# Altium schematic symbol library jlcpcb_2025_04_capacitors_extended_0402.schlib: 3594 symbols (part 5 of 20) (continued)
## C0402C223K5RAC7867
designator C?  Capacitance: 22nF  (hidden comment: *)
Capacitor, Ceramic (MLCC), 22nF, ±10%, 50V, X7R, ±10%, SMD 0402; Manufacturer: KEMET; Manufacturer Part Number: C0402C223K5RAC7867; Package Size: 0402; JLCPCB Basic Part: No; JLCPCB Part Number: C141059; Supplier 1: LCSC; Category: Capacitors - MLCC; Supplier Part Number 1: C141059; Tolerance: ±10%; Voltage Rating: 50V; Temperature Coefficient: X7R; RoHS: Yes; ComponentLink1Description: Datasheet; ComponentLink1URL: https://wmsc.lcsc.com/wmsc/upload/file/pdf/v2/lcsc/2304140030_KEMET-C0402C223K5RAC7867_C141059.pdf; ComponentLink2Description: JLCPCB Part URL; ComponentLink2URL: https://jlcpcb.com/partdetail/C141059; ComponentLink3Description: LCSC Part URL; ComponentLink3URL: https://lcsc.com/product-detail/Multilayer-Ceramic-Capacitors-MLCC---SMD-SMT_KEMET-KEMET-C0402C223K5RAC7867_C141059.html
footprint CAP-0402 (0402 (1005M) Capacitor)
pins: 1, 2

## C0402C225M8PAC7867
designator C?  Capacitance: 2.2uF  (hidden comment: *)
Capacitor, Ceramic (MLCC), 2.2uF, ±20%, 10V, X5R, ±20%, SMD 0402; Manufacturer: KEMET; Manufacturer Part Number: C0402C225M8PAC7867; Package Size: 0402; JLCPCB Basic Part: No; JLCPCB Part Number: C696354; Supplier 1: LCSC; Category: Capacitors - MLCC; Supplier Part Number 1: C696354; Tolerance: ±20%; Voltage Rating: 10V; Temperature Coefficient: X5R; RoHS: Yes; ComponentLink1Description: Datasheet; ComponentLink1URL: https://wmsc.lcsc.com/wmsc/upload/file/pdf/v2/lcsc/2304140030_KEMET-C0402C225M8PAC7867_C696354.pdf; ComponentLink2Description: JLCPCB Part URL; ComponentLink2URL: https://jlcpcb.com/partdetail/C696354; ComponentLink3Description: LCSC Part URL; ComponentLink3URL: https://lcsc.com/product-detail/Multilayer-Ceramic-Capacitors-MLCC---SMD-SMT_KEMET-KEMET-C0402C225M8PAC7867_C696354.html
footprint CAP-0402 (0402 (1005M) Capacitor)
pins: 1, 2

## C0402C225M9PACTU
designator C?  Capacitance: 2.2uF  (hidden comment: *)
Capacitor, Ceramic (MLCC), 2.2uF, ±20%, 6.3V, X5R, ±20%, SMD 0402; Manufacturer: KEMET; Manufacturer Part Number: C0402C225M9PACTU; Package Size: 0402; JLCPCB Basic Part: No; JLCPCB Part Number: C452745; Supplier 1: LCSC; Category: Capacitors - MLCC; Supplier Part Number 1: C452745; Tolerance: ±20%; Voltage Rating: 6.3V; Temperature Coefficient: X5R; RoHS: Yes; ComponentLink1Description: Datasheet; ComponentLink1URL: https://wmsc.lcsc.com/wmsc/upload/file/pdf/v2/lcsc/2304140030_KEMET-C0402C225M9PACTU_C452745.pdf; ComponentLink2Description: JLCPCB Part URL; ComponentLink2URL: https://jlcpcb.com/partdetail/C452745; ComponentLink3Description: LCSC Part URL; ComponentLink3URL: https://lcsc.com/product-detail/Multilayer-Ceramic-Capacitors-MLCC---SMD-SMT_KEMET-KEMET-C0402C225M9PACTU_C452745.html
footprint CAP-0402 (0402 (1005M) Capacitor)
pins: 1, 2

## C0402C391K5RACAUTO
designator C?  Capacitance: 390pF  (hidden comment: *)
Capacitor, Ceramic (MLCC), 390pF, ±10%, 50V, X7R, ±10%, SMD 0402; Manufacturer: KEMET; Manufacturer Part Number: C0402C391K5RACAUTO; Package Size: 0402; JLCPCB Basic Part: No; JLCPCB Part Number: C561805; Supplier 1: LCSC; Category: Capacitors - MLCC; Supplier Part Number 1: C561805; Tolerance: ±10%; Voltage Rating: 50V; Temperature Coefficient: X7R; RoHS: Yes; ComponentLink1Description: Datasheet; ComponentLink1URL: https://wmsc.lcsc.com/wmsc/upload/file/pdf/v2/lcsc/2006031011_KEMET-C0402C391K5RACAUTO_C561805.pdf; ComponentLink2Description: JLCPCB Part URL; ComponentLink2URL: https://jlcpcb.com/partdetail/C561805; ComponentLink3Description: LCSC Part URL; ComponentLink3URL: https://lcsc.com/product-detail/Multilayer-Ceramic-Capacitors-MLCC---SMD-SMT_KEMET-KEMET-C0402C391K5RACAUTO_C561805.html
footprint CAP-0402 (0402 (1005M) Capacitor)
pins: 1, 2

## C0402C470J5GAC7867
designator C?  Capacitance: 47pF  (hidden comment: *)
Capacitor, Ceramic (MLCC), 47pF, ±5%, 50V, C0G, ±5%, SMD 0402; Manufacturer: KEMET; Manufacturer Part Number: C0402C470J5GAC7867; Package Size: 0402; JLCPCB Basic Part: No; JLCPCB Part Number: C140942; Supplier 1: LCSC; Category: Capacitors - MLCC; Supplier Part Number 1: C140942; Tolerance: ±5%; Voltage Rating: 50V; Temperature Coefficient: C0G; RoHS: Yes; ComponentLink1Description: Datasheet; ComponentLink1URL: https://wmsc.lcsc.com/wmsc/upload/file/pdf/v2/lcsc/2304140030_KEMET-C0402C470J5GAC7867_C140942.pdf; ComponentLink2Description: JLCPCB Part URL; ComponentLink2URL: https://jlcpcb.com/partdetail/C140942; ComponentLink3Description: LCSC Part URL; ComponentLink3URL: https://lcsc.com/product-detail/Multilayer-Ceramic-Capacitors-MLCC---SMD-SMT_KEMET-KEMET-C0402C470J5GAC7867_C140942.html
footprint CAP-0402 (0402 (1005M) Capacitor)
pins: 1, 2

## C0402C470K5GACTU
designator C?  Capacitance: 47pF  (hidden comment: *)
Capacitor, Ceramic (MLCC), 47pF, ±10%, 50V, C0G, ±10%, SMD 0402; Manufacturer: KEMET; Manufacturer Part Number: C0402C470K5GACTU; Package Size: 0402; JLCPCB Basic Part: No; JLCPCB Part Number: C2168628; Supplier 1: LCSC; Category: Capacitors - MLCC; Supplier Part Number 1: C2168628; Tolerance: ±10%; Voltage Rating: 50V; Temperature Coefficient: C0G; RoHS: Yes; ComponentLink1Description: Datasheet; ComponentLink1URL: https://wmsc.lcsc.com/wmsc/upload/file/pdf/v2/lcsc/2304140030_KEMET-C0402C470K5GACTU_C2168628.pdf; ComponentLink2Description: JLCPCB Part URL; ComponentLink2URL: https://jlcpcb.com/partdetail/C2168628; ComponentLink3Description: LCSC Part URL; ComponentLink3URL: https://lcsc.com/product-detail/Multilayer-Ceramic-Capacitors-MLCC---SMD-SMT_KEMET-KEMET-C0402C470K5GACTU_C2168628.html
footprint CAP-0402 (0402 (1005M) Capacitor)
pins: 1, 2

## C0402C474K9PAC7867
designator C?  Capacitance: 470nF  (hidden comment: *)
Capacitor, Ceramic (MLCC), 470nF, ±10%, 6.3V, X5R, ±10%, SMD 0402; Manufacturer: KEMET; Manufacturer Part Number: C0402C474K9PAC7867; Package Size: 0402; JLCPCB Basic Part: No; JLCPCB Part Number: C696355; Supplier 1: LCSC; Category: Capacitors - MLCC; Supplier Part Number 1: C696355; Tolerance: ±10%; Voltage Rating: 6.3V; Temperature Coefficient: X5R; RoHS: Yes; ComponentLink1Description: Datasheet; ComponentLink1URL: https://wmsc.lcsc.com/wmsc/upload/file/pdf/v2/lcsc/2304140030_KEMET-C0402C474K9PAC7867_C696355.pdf; ComponentLink2Description: JLCPCB Part URL; ComponentLink2URL: https://jlcpcb.com/partdetail/C696355; ComponentLink3Description: LCSC Part URL; ComponentLink3URL: https://lcsc.com/product-detail/Multilayer-Ceramic-Capacitors-MLCC---SMD-SMT_KEMET-KEMET-C0402C474K9PAC7867_C696355.html
footprint CAP-0402 (0402 (1005M) Capacitor)
pins: 1, 2

## C0402C822K5RAC7867
designator C?  Capacitance: 8.2nF  (hidden comment: *)
Capacitor, Ceramic (MLCC), 8.2nF, ±10%, 50V, X7R, ±10%, SMD 0402; Manufacturer: KEMET; Manufacturer Part Number: C0402C822K5RAC7867; Package Size: 0402; JLCPCB Basic Part: No; JLCPCB Part Number: C141063; Supplier 1: LCSC; Category: Capacitors - MLCC; Supplier Part Number 1: C141063; Tolerance: ±10%; Voltage Rating: 50V; Temperature Coefficient: X7R; RoHS: Yes; ComponentLink1Description: Datasheet; ComponentLink1URL: https://wmsc.lcsc.com/wmsc/upload/file/pdf/v2/lcsc/2304140030_KEMET-C0402C822K5RAC7867_C141063.pdf; ComponentLink2Description: JLCPCB Part URL; ComponentLink2URL: https://jlcpcb.com/partdetail/C141063; ComponentLink3Description: LCSC Part URL; ComponentLink3URL: https://lcsc.com/product-detail/Multilayer-Ceramic-Capacitors-MLCC---SMD-SMT_KEMET-KEMET-C0402C822K5RAC7867_C141063.html
footprint CAP-0402 (0402 (1005M) Capacitor)
pins: 1, 2

## C0402COG102J500NT
designator C?  Capacitance: 1nF  (hidden comment: *)
Capacitor, Ceramic (MLCC), 1nF, 50V, SMD 0402; Manufacturer: SANYEAR; Manufacturer Part Number: C0402COG102J500NT; Package Size: 0402; JLCPCB Basic Part: No; JLCPCB Part Number: C2835508; Supplier 1: LCSC; Category: Capacitors - MLCC; Supplier Part Number 1: C2835508; Voltage Rating: 50V; RoHS: Yes; ComponentLink1Description: Datasheet; ComponentLink1URL: https://wmsc.lcsc.com/wmsc/upload/file/pdf/v2/lcsc/2304140030_SANYEAR-C0402COG102J500NT_C2835508.pdf; ComponentLink2Description: JLCPCB Part URL; ComponentLink2URL: https://jlcpcb.com/partdetail/C2835508; ComponentLink3Description: LCSC Part URL; ComponentLink3URL: https://lcsc.com/product-detail/Multilayer-Ceramic-Capacitors-MLCC---SMD-SMT_SANYEAR-SANYEAR-C0402COG102J500NT_C2835508.html
footprint CAP-0402 (0402 (1005M) Capacitor)
pins: 1, 2

## C0402R105K010TOF
designator C?  Capacitance: 1uF  (hidden comment: *)
Capacitor, Ceramic (MLCC), 1uF, ±10%, 10V, X7S, ±10%, SMD 0402; Manufacturer: IHHEC(HOLY STONE ENTERPRISE CO., LTD); Manufacturer Part Number: C0402R105K010TOF; Package Size: 0402; JLCPCB Basic Part: No; JLCPCB Part Number: C4355178; Supplier 1: LCSC; Category: Capacitors - MLCC; Supplier Part Number 1: C4355178; Tolerance: ±10%; Voltage Rating: 10V; Temperature Coefficient: X7S; RoHS: Yes; ComponentLink1Description: Datasheet; ComponentLink1URL: https://wmsc.lcsc.com/wmsc/upload/file/pdf/v2/lcsc/2207151800_IHHEC-HOLY-STONE-ENTERPRISE-CO---LTD-C0402R105K010TOF_C4355178.pdf; ComponentLink2Description: JLCPCB Part URL; ComponentLink2URL: https://jlcpcb.com/partdetail/C4355178; ComponentLink3Description: LCSC Part URL; ComponentLink3URL: https://lcsc.com/product-detail/Multilayer-Ceramic-Capacitors-MLCC---SMD-SMT_IHHECHOLY-STONE-ENTERPRISE-CO.%2C-LTD-IHHECHOLY-STONE-ENTERPRISE-CO.%2C-LTD-C0402R105K010TOF_C4355178.html
footprint CAP-0402 (0402 (1005M) Capacitor)
pins: 1, 2

## C0402X5R103K250NTB
designator C?  Capacitance: 10nF  (hidden comment: *)
Capacitor, Ceramic (MLCC), 10nF, ±10%, 25V, X5R, ±10%, SMD 0402; Manufacturer: EYANG(Shenzhen Eyang Tech Development); Manufacturer Part Number: C0402X5R103K250NTB; Package Size: 0402; JLCPCB Basic Part: No; JLCPCB Part Number: C778299; Supplier 1: LCSC; Category: Capacitors - MLCC; Supplier Part Number 1: C778299; Tolerance: ±10%; Voltage Rating: 25V; Temperature Coefficient: X5R; RoHS: Yes; ComponentLink1Description: Datasheet; ComponentLink1URL: https://datasheet.lcsc.com/lcsc/2009051609_EYANG-Shenzhen-Eyang-Tech-Development-C0402X5R103K250NTB_C778299.pdf; ComponentLink2Description: JLCPCB Part URL; ComponentLink2URL: https://jlcpcb.com/partdetail/C778299; ComponentLink3Description: LCSC Part URL; ComponentLink3URL: https://lcsc.com/product-detail/Multilayer-Ceramic-Capacitors-MLCC---SMD-SMT_EYANGShenzhen-Eyang-Tech-Development-EYANGShenzhen-Eyang-Tech-Development-C0402X5R103K250NTB_C778299.html
footprint CAP-0402 (0402 (1005M) Capacitor)
pins: 1, 2

## C0402X5R104K160NTB
designator C?  Capacitance: 100nF  (hidden comment: *)
Capacitor, Ceramic (MLCC), 100nF, ±10%, 16V, X5R, ±10%, SMD 0402; Manufacturer: EYANG(Shenzhen Eyang Tech Development); Manufacturer Part Number: C0402X5R104K160NTB; Package Size: 0402; JLCPCB Basic Part: No; JLCPCB Part Number: C115656; Supplier 1: LCSC; Category: Capacitors - MLCC; Supplier Part Number 1: C115656; Tolerance: ±10%; Voltage Rating: 16V; Temperature Coefficient: X5R; RoHS: Yes; ComponentLink1Description: Datasheet; ComponentLink1URL: https://datasheet.lcsc.com/lcsc/2304140030_EYANG-Shenzhen-Eyang-Tech-Development-C0402X5R104K160NTB_C115656.pdf; ComponentLink2Description: JLCPCB Part URL; ComponentLink2URL: https://jlcpcb.com/partdetail/C115656; ComponentLink3Description: LCSC Part URL; ComponentLink3URL: https://lcsc.com/product-detail/Multilayer-Ceramic-Capacitors-MLCC---SMD-SMT_EYANGShenzhen-Eyang-Tech-Development-EYANGShenzhen-Eyang-Tech-Development-C0402X5R104K160NTB_C115656.html
footprint CAP-0402 (0402 (1005M) Capacitor)
pins: 1, 2

## C0402X5R105K160NT
designator C?  Capacitance: 1uF  (hidden comment: *)
Capacitor, Ceramic (MLCC), 1uF, ±10%, 16V, ±10%, SMD 0402; Manufacturer: SANYEAR; Manufacturer Part Number: C0402X5R105K160NT; Package Size: 0402; JLCPCB Basic Part: No; JLCPCB Part Number: C466611; Supplier 1: LCSC; Category: Capacitors - MLCC; Supplier Part Number 1: C466611; Tolerance: ±10%; Voltage Rating: 16V; RoHS: Yes; ComponentLink1Description: Datasheet; ComponentLink1URL: https://wmsc.lcsc.com/wmsc/upload/file/pdf/v2/lcsc/2304140030_SANYEAR-C0402X5R105K160NT_C466611.pdf; ComponentLink2Description: JLCPCB Part URL; ComponentLink2URL: https://jlcpcb.com/partdetail/C466611; ComponentLink3Description: LCSC Part URL; ComponentLink3URL: https://lcsc.com/product-detail/Multilayer-Ceramic-Capacitors-MLCC---SMD-SMT_SANYEAR-SANYEAR-C0402X5R105K160NT_C466611.html
footprint CAP-0402 (0402 (1005M) Capacitor)
pins: 1, 2

## C0402X5R105K250NT
designator C?  Capacitance: 1uF  (hidden comment: *)
Capacitor, Ceramic (MLCC), 1uF, ±10%, 25V, X5R, ±10%, SMD 0402; Manufacturer: SANYEAR; Manufacturer Part Number: C0402X5R105K250NT; Package Size: 0402; JLCPCB Basic Part: No; JLCPCB Part Number: C466612; Supplier 1: LCSC; Category: Capacitors - MLCC; Supplier Part Number 1: C466612; Tolerance: ±10%; Voltage Rating: 25V; Temperature Coefficient: X5R; RoHS: Yes; ComponentLink1Description: Datasheet; ComponentLink1URL: https://wmsc.lcsc.com/wmsc/upload/file/pdf/v2/lcsc/2304140030_SANYEAR-C0402X5R105K250NT_C466612.pdf; ComponentLink2Description: JLCPCB Part URL; ComponentLink2URL: https://jlcpcb.com/partdetail/C466612; ComponentLink3Description: LCSC Part URL; ComponentLink3URL: https://lcsc.com/product-detail/Multilayer-Ceramic-Capacitors-MLCC---SMD-SMT_SANYEAR-SANYEAR-C0402X5R105K250NT_C466612.html
footprint CAP-0402 (0402 (1005M) Capacitor)
pins: 1, 2

## C0402X5R105M6R3NT
designator C?  Capacitance: 1uF  (hidden comment: *)
Capacitor, Ceramic (MLCC), 1uF, ±20%, 6.3V, X5R, ±20%, SMD 0402; Manufacturer: SANYEAR; Manufacturer Part Number: C0402X5R105M6R3NT; Package Size: 0402; JLCPCB Basic Part: No; JLCPCB Part Number: C475247; Supplier 1: LCSC; Category: Capacitors - MLCC; Supplier Part Number 1: C475247; Tolerance: ±20%; Voltage Rating: 6.3V; Temperature Coefficient: X5R; RoHS: Yes; ComponentLink1Description: Datasheet; ComponentLink1URL: https://wmsc.lcsc.com/wmsc/upload/file/pdf/v2/lcsc/2304140030_SANYEAR-C0402X5R105M6R3NT_C475247.pdf; ComponentLink2Description: JLCPCB Part URL; ComponentLink2URL: https://jlcpcb.com/partdetail/C475247; ComponentLink3Description: LCSC Part URL; ComponentLink3URL: https://lcsc.com/product-detail/Multilayer-Ceramic-Capacitors-MLCC---SMD-SMT_SANYEAR-SANYEAR-C0402X5R105M6R3NT_C475247.html
footprint CAP-0402 (0402 (1005M) Capacitor)
pins: 1, 2

## C0402X5R223K500NTB
designator C?  Capacitance: 22nF  (hidden comment: *)
Capacitor, Ceramic (MLCC), 22nF, ±10%, 50V, X5R, ±10%, SMD 0402; Manufacturer: EYANG(Shenzhen Eyang Tech Development); Manufacturer Part Number: C0402X5R223K500NTB; Package Size: 0402; JLCPCB Basic Part: No; JLCPCB Part Number: C115662; Supplier 1: LCSC; Category: Capacitors - MLCC; Supplier Part Number 1: C115662; Tolerance: ±10%; Voltage Rating: 50V; Temperature Coefficient: X5R; RoHS: Yes; ComponentLink1Description: Datasheet; ComponentLink1URL: https://datasheet.lcsc.com/lcsc/2304140030_EYANG-Shenzhen-Eyang-Tech-Development-C0402X5R223K500NTB_C115662.pdf; ComponentLink2Description: JLCPCB Part URL; ComponentLink2URL: https://jlcpcb.com/partdetail/C115662; ComponentLink3Description: LCSC Part URL; ComponentLink3URL: https://lcsc.com/product-detail/Multilayer-Ceramic-Capacitors-MLCC---SMD-SMT_EYANGShenzhen-Eyang-Tech-Development-EYANGShenzhen-Eyang-Tech-Development-C0402X5R223K500NTB_C115662.html
footprint CAP-0402 (0402 (1005M) Capacitor)
pins: 1, 2

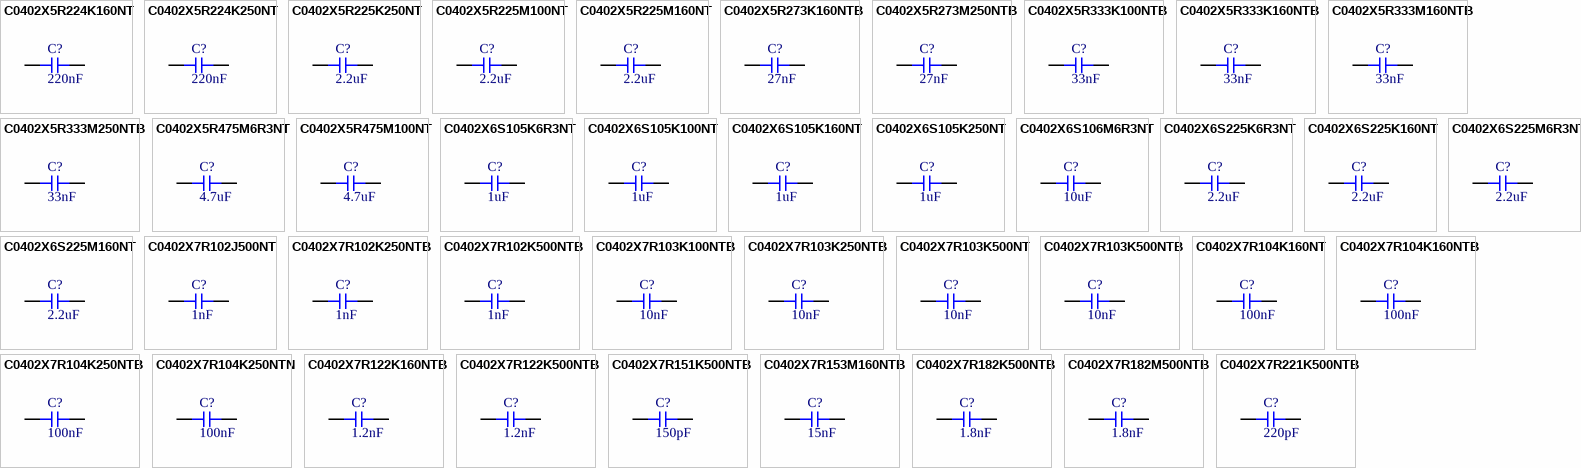
[diagram p21: symbols C0402X5R224K160NT to C0402X7R221K500NTB]

## C0402X5R224K160NT
designator C?  Capacitance: 220nF  (hidden comment: *)
Capacitor, Ceramic (MLCC), 220nF, ±10%, 16V, X5R, ±10%, SMD 0402; Manufacturer: SANYEAR; Manufacturer Part Number: C0402X5R224K160NT; Package Size: 0402; JLCPCB Basic Part: No; JLCPCB Part Number: C466616; Supplier 1: LCSC; Category: Capacitors - MLCC; Supplier Part Number 1: C466616; Tolerance: ±10%; Voltage Rating: 16V; Temperature Coefficient: X5R; RoHS: Yes; ComponentLink1Description: Datasheet; ComponentLink1URL: https://wmsc.lcsc.com/wmsc/upload/file/pdf/v2/lcsc/2304140030_SANYEAR-C0402X5R224K160NT_C466616.pdf; ComponentLink2Description: JLCPCB Part URL; ComponentLink2URL: https://jlcpcb.com/partdetail/C466616; ComponentLink3Description: LCSC Part URL; ComponentLink3URL: https://lcsc.com/product-detail/Multilayer-Ceramic-Capacitors-MLCC---SMD-SMT_SANYEAR-SANYEAR-C0402X5R224K160NT_C466616.html
footprint CAP-0402 (0402 (1005M) Capacitor)
pins: 1, 2

## C0402X5R224K250NT
designator C?  Capacitance: 220nF  (hidden comment: *)
Capacitor, Ceramic (MLCC), 220nF, ±10%, 25V, X5R, ±10%, SMD 0402; Manufacturer: SANYEAR; Manufacturer Part Number: C0402X5R224K250NT; Package Size: 0402; JLCPCB Basic Part: No; JLCPCB Part Number: C466617; Supplier 1: LCSC; Category: Capacitors - MLCC; Supplier Part Number 1: C466617; Tolerance: ±10%; Voltage Rating: 25V; Temperature Coefficient: X5R; RoHS: Yes; ComponentLink1Description: Datasheet; ComponentLink1URL: https://wmsc.lcsc.com/wmsc/upload/file/pdf/v2/lcsc/2304140030_SANYEAR-C0402X5R224K250NT_C466617.pdf; ComponentLink2Description: JLCPCB Part URL; ComponentLink2URL: https://jlcpcb.com/partdetail/C466617; ComponentLink3Description: LCSC Part URL; ComponentLink3URL: https://lcsc.com/product-detail/Multilayer-Ceramic-Capacitors-MLCC---SMD-SMT_SANYEAR-SANYEAR-C0402X5R224K250NT_C466617.html
footprint CAP-0402 (0402 (1005M) Capacitor)
pins: 1, 2

## C0402X5R225K250NT
designator C?  Capacitance: 2.2uF  (hidden comment: *)
Capacitor, Ceramic (MLCC), 2.2uF, ±10%, 25V, ±10%, SMD 0402; Manufacturer: SANYEAR; Manufacturer Part Number: C0402X5R225K250NT; Package Size: 0402; JLCPCB Basic Part: No; JLCPCB Part Number: C729452; Supplier 1: LCSC; Category: Capacitors - MLCC; Supplier Part Number 1: C729452; Tolerance: ±10%; Voltage Rating: 25V; RoHS: Yes; ComponentLink1Description: Datasheet; ComponentLink1URL: https://wmsc.lcsc.com/wmsc/upload/file/pdf/v2/lcsc/2304140030_SANYEAR-C0402X5R225K250NT_C729452.pdf; ComponentLink2Description: JLCPCB Part URL; ComponentLink2URL: https://jlcpcb.com/partdetail/C729452; ComponentLink3Description: LCSC Part URL; ComponentLink3URL: https://lcsc.com/product-detail/Multilayer-Ceramic-Capacitors-MLCC---SMD-SMT_SANYEAR-SANYEAR-C0402X5R225K250NT_C729452.html
footprint CAP-0402 (0402 (1005M) Capacitor)
pins: 1, 2

## C0402X5R225M100NT
designator C?  Capacitance: 2.2uF  (hidden comment: *)
Capacitor, Ceramic (MLCC), 2.2uF, ±20%, 10V, ±20%, SMD 0402; Manufacturer: SANYEAR; Manufacturer Part Number: C0402X5R225M100NT; Package Size: 0402; JLCPCB Basic Part: No; JLCPCB Part Number: C466619; Supplier 1: LCSC; Category: Capacitors - MLCC; Supplier Part Number 1: C466619; Tolerance: ±20%; Voltage Rating: 10V; RoHS: Yes; ComponentLink1Description: Datasheet; ComponentLink1URL: https://wmsc.lcsc.com/wmsc/upload/file/pdf/v2/lcsc/2304140030_SANYEAR-C0402X5R225M100NT_C466619.pdf; ComponentLink2Description: JLCPCB Part URL; ComponentLink2URL: https://jlcpcb.com/partdetail/C466619; ComponentLink3Description: LCSC Part URL; ComponentLink3URL: https://lcsc.com/product-detail/Multilayer-Ceramic-Capacitors-MLCC---SMD-SMT_SANYEAR-SANYEAR-C0402X5R225M100NT_C466619.html
footprint CAP-0402 (0402 (1005M) Capacitor)
pins: 1, 2

## C0402X5R225M160NT
designator C?  Capacitance: 2.2uF  (hidden comment: *)
Capacitor, Ceramic (MLCC), 2.2uF, ±20%, 16V, ±20%, SMD 0402; Manufacturer: SANYEAR; Manufacturer Part Number: C0402X5R225M160NT; Package Size: 0402; JLCPCB Basic Part: No; JLCPCB Part Number: C729449; Supplier 1: LCSC; Category: Capacitors - MLCC; Supplier Part Number 1: C729449; Tolerance: ±20%; Voltage Rating: 16V; RoHS: Yes; ComponentLink1Description: Datasheet; ComponentLink1URL: https://wmsc.lcsc.com/wmsc/upload/file/pdf/v2/lcsc/2304140030_SANYEAR-C0402X5R225M160NT_C729449.pdf; ComponentLink2Description: JLCPCB Part URL; ComponentLink2URL: https://jlcpcb.com/partdetail/C729449; ComponentLink3Description: LCSC Part URL; ComponentLink3URL: https://lcsc.com/product-detail/Multilayer-Ceramic-Capacitors-MLCC---SMD-SMT_SANYEAR-SANYEAR-C0402X5R225M160NT_C729449.html
footprint CAP-0402 (0402 (1005M) Capacitor)
pins: 1, 2

## C0402X5R273K160NTB
designator C?  Capacitance: 27nF  (hidden comment: *)
Capacitor, Ceramic (MLCC), 27nF, ±10%, 16V, X5R, ±10%, SMD 0402; Manufacturer: EYANG(Shenzhen Eyang Tech Development); Manufacturer Part Number: C0402X5R273K160NTB; Package Size: 0402; JLCPCB Basic Part: No; JLCPCB Part Number: C778312; Supplier 1: LCSC; Category: Capacitors - MLCC; Supplier Part Number 1: C778312; Tolerance: ±10%; Voltage Rating: 16V; Temperature Coefficient: X5R; RoHS: Yes; ComponentLink1Description: Datasheet; ComponentLink1URL: https://datasheet.lcsc.com/lcsc/2009051609_EYANG-Shenzhen-Eyang-Tech-Development-C0402X5R273K160NTB_C778312.pdf; ComponentLink2Description: JLCPCB Part URL; ComponentLink2URL: https://jlcpcb.com/partdetail/C778312; ComponentLink3Description: LCSC Part URL; ComponentLink3URL: https://lcsc.com/product-detail/Multilayer-Ceramic-Capacitors-MLCC---SMD-SMT_EYANGShenzhen-Eyang-Tech-Development-EYANGShenzhen-Eyang-Tech-Development-C0402X5R273K160NTB_C778312.html
footprint CAP-0402 (0402 (1005M) Capacitor)
pins: 1, 2

## C0402X5R273M250NTB
designator C?  Capacitance: 27nF  (hidden comment: *)
Capacitor, Ceramic (MLCC), 27nF, ±20%, 25V, X5R, ±20%, SMD 0402; Manufacturer: EYANG(Shenzhen Eyang Tech Development); Manufacturer Part Number: C0402X5R273M250NTB; Package Size: 0402; JLCPCB Basic Part: No; JLCPCB Part Number: C778223; Supplier 1: LCSC; Category: Capacitors - MLCC; Supplier Part Number 1: C778223; Tolerance: ±20%; Voltage Rating: 25V; Temperature Coefficient: X5R; RoHS: Yes; ComponentLink1Description: Datasheet; ComponentLink1URL: https://datasheet.lcsc.com/lcsc/2009051507_EYANG-Shenzhen-Eyang-Tech-Development-C0402X5R273M250NTB_C778223.pdf; ComponentLink2Description: JLCPCB Part URL; ComponentLink2URL: https://jlcpcb.com/partdetail/C778223; ComponentLink3Description: LCSC Part URL; ComponentLink3URL: https://lcsc.com/product-detail/Multilayer-Ceramic-Capacitors-MLCC---SMD-SMT_EYANGShenzhen-Eyang-Tech-Development-EYANGShenzhen-Eyang-Tech-Development-C0402X5R273M250NTB_C778223.html
footprint CAP-0402 (0402 (1005M) Capacitor)
pins: 1, 2

## C0402X5R333K100NTB
designator C?  Capacitance: 33nF  (hidden comment: *)
Capacitor, Ceramic (MLCC), 33nF, ±10%, 10V, X5R, ±10%, SMD 0402; Manufacturer: EYANG(Shenzhen Eyang Tech Development); Manufacturer Part Number: C0402X5R333K100NTB; Package Size: 0402; JLCPCB Basic Part: No; JLCPCB Part Number: C183772; Supplier 1: LCSC; Category: Capacitors - MLCC; Supplier Part Number 1: C183772; Tolerance: ±10%; Voltage Rating: 10V; Temperature Coefficient: X5R; RoHS: Yes; ComponentLink1Description: Datasheet; ComponentLink1URL: https://datasheet.lcsc.com/lcsc/2304140030_EYANG-Shenzhen-Eyang-Tech-Development-C0402X5R333K100NTB_C183772.pdf; ComponentLink2Description: JLCPCB Part URL; ComponentLink2URL: https://jlcpcb.com/partdetail/C183772; ComponentLink3Description: LCSC Part URL; ComponentLink3URL: https://lcsc.com/product-detail/Multilayer-Ceramic-Capacitors-MLCC---SMD-SMT_EYANGShenzhen-Eyang-Tech-Development-EYANGShenzhen-Eyang-Tech-Development-C0402X5R333K100NTB_C183772.html
footprint CAP-0402 (0402 (1005M) Capacitor)
pins: 1, 2

## C0402X5R333K160NTB
designator C?  Capacitance: 33nF  (hidden comment: *)
Capacitor, Ceramic (MLCC), 33nF, ±10%, 16V, X5R, ±10%, SMD 0402; Manufacturer: EYANG(Shenzhen Eyang Tech Development); Manufacturer Part Number: C0402X5R333K160NTB; Package Size: 0402; JLCPCB Basic Part: No; JLCPCB Part Number: C115664; Supplier 1: LCSC; Category: Capacitors - MLCC; Supplier Part Number 1: C115664; Tolerance: ±10%; Voltage Rating: 16V; Temperature Coefficient: X5R; RoHS: Yes; ComponentLink1Description: Datasheet; ComponentLink1URL: https://datasheet.lcsc.com/lcsc/2304140030_EYANG-Shenzhen-Eyang-Tech-Development-C0402X5R333K160NTB_C115664.pdf; ComponentLink2Description: JLCPCB Part URL; ComponentLink2URL: https://jlcpcb.com/partdetail/C115664; ComponentLink3Description: LCSC Part URL; ComponentLink3URL: https://lcsc.com/product-detail/Multilayer-Ceramic-Capacitors-MLCC---SMD-SMT_EYANGShenzhen-Eyang-Tech-Development-EYANGShenzhen-Eyang-Tech-Development-C0402X5R333K160NTB_C115664.html
footprint CAP-0402 (0402 (1005M) Capacitor)
pins: 1, 2

## C0402X5R333M160NTB
designator C?  Capacitance: 33nF  (hidden comment: *)
Capacitor, Ceramic (MLCC), 33nF, ±20%, 16V, X5R, ±20%, SMD 0402; Manufacturer: EYANG(Shenzhen Eyang Tech Development); Manufacturer Part Number: C0402X5R333M160NTB; Package Size: 0402; JLCPCB Basic Part: No; JLCPCB Part Number: C183769; Supplier 1: LCSC; Category: Capacitors - MLCC; Supplier Part Number 1: C183769; Tolerance: ±20%; Voltage Rating: 16V; Temperature Coefficient: X5R; RoHS: Yes; ComponentLink1Description: Datasheet; ComponentLink1URL: https://datasheet.lcsc.com/lcsc/2304140030_EYANG-Shenzhen-Eyang-Tech-Development-C0402X5R333M160NTB_C183769.pdf; ComponentLink2Description: JLCPCB Part URL; ComponentLink2URL: https://jlcpcb.com/partdetail/C183769; ComponentLink3Description: LCSC Part URL; ComponentLink3URL: https://lcsc.com/product-detail/Multilayer-Ceramic-Capacitors-MLCC---SMD-SMT_EYANGShenzhen-Eyang-Tech-Development-EYANGShenzhen-Eyang-Tech-Development-C0402X5R333M160NTB_C183769.html
footprint CAP-0402 (0402 (1005M) Capacitor)
pins: 1, 2

## C0402X5R333M250NTB
designator C?  Capacitance: 33nF  (hidden comment: *)
Capacitor, Ceramic (MLCC), 33nF, ±20%, 25V, X5R, ±20%, SMD 0402; Manufacturer: EYANG(Shenzhen Eyang Tech Development); Manufacturer Part Number: C0402X5R333M250NTB; Package Size: 0402; JLCPCB Basic Part: No; JLCPCB Part Number: C188402; Supplier 1: LCSC; Category: Capacitors - MLCC; Supplier Part Number 1: C188402; Tolerance: ±20%; Voltage Rating: 25V; Temperature Coefficient: X5R; RoHS: Yes; ComponentLink1Description: Datasheet; ComponentLink1URL: https://datasheet.lcsc.com/lcsc/1811021623_EYANG-Shenzhen-Eyang-Tech-Development-C0402X5R333M250NTB_C188402.pdf; ComponentLink2Description: JLCPCB Part URL; ComponentLink2URL: https://jlcpcb.com/partdetail/C188402; ComponentLink3Description: LCSC Part URL; ComponentLink3URL: https://lcsc.com/product-detail/Multilayer-Ceramic-Capacitors-MLCC---SMD-SMT_EYANGShenzhen-Eyang-Tech-Development-EYANGShenzhen-Eyang-Tech-Development-C0402X5R333M250NTB_C188402.html
footprint CAP-0402 (0402 (1005M) Capacitor)
pins: 1, 2

## C0402X5R475M6R3NT
designator C?  Capacitance: 4.7uF  (hidden comment: *)
Capacitor, Ceramic (MLCC), 4.7uF, ±20%, 6.3V, ±20%, SMD 0402; Manufacturer: SANYEAR; Manufacturer Part Number: C0402X5R475M6R3NT; Package Size: 0402; JLCPCB Basic Part: No; JLCPCB Part Number: C466620; Supplier 1: LCSC; Category: Capacitors - MLCC; Supplier Part Number 1: C466620; Tolerance: ±20%; Voltage Rating: 6.3V; RoHS: Yes; ComponentLink1Description: Datasheet; ComponentLink1URL: https://wmsc.lcsc.com/wmsc/upload/file/pdf/v2/lcsc/2304140030_SANYEAR-C0402X5R475M6R3NT_C466620.pdf; ComponentLink2Description: JLCPCB Part URL; ComponentLink2URL: https://jlcpcb.com/partdetail/C466620; ComponentLink3Description: LCSC Part URL; ComponentLink3URL: https://lcsc.com/product-detail/Multilayer-Ceramic-Capacitors-MLCC---SMD-SMT_SANYEAR-SANYEAR-C0402X5R475M6R3NT_C466620.html
footprint CAP-0402 (0402 (1005M) Capacitor)
pins: 1, 2

## C0402X5R475M100NT
designator C?  Capacitance: 4.7uF  (hidden comment: *)
Capacitor, Ceramic (MLCC), 4.7uF, ±20%, 10V, X5R, ±20%, SMD 0402; Manufacturer: SANYEAR; Manufacturer Part Number: C0402X5R475M100NT; Package Size: 0402; JLCPCB Basic Part: No; JLCPCB Part Number: C466621; Supplier 1: LCSC; Category: Capacitors - MLCC; Supplier Part Number 1: C466621; Tolerance: ±20%; Voltage Rating: 10V; Temperature Coefficient: X5R; RoHS: Yes; ComponentLink1Description: Datasheet; ComponentLink1URL: https://wmsc.lcsc.com/wmsc/upload/file/pdf/v2/lcsc/2304140030_SANYEAR-C0402X5R475M100NT_C466621.pdf; ComponentLink2Description: JLCPCB Part URL; ComponentLink2URL: https://jlcpcb.com/partdetail/C466621; ComponentLink3Description: LCSC Part URL; ComponentLink3URL: https://lcsc.com/product-detail/Multilayer-Ceramic-Capacitors-MLCC---SMD-SMT_SANYEAR-SANYEAR-C0402X5R475M100NT_C466621.html
footprint CAP-0402 (0402 (1005M) Capacitor)
pins: 1, 2

## C0402X6S105K6R3NT
designator C?  Capacitance: 1uF  (hidden comment: *)
Capacitor, Ceramic (MLCC), 1uF, ±10%, 6.3V, ±10%, SMD 0402; Manufacturer: SANYEAR; Manufacturer Part Number: C0402X6S105K6R3NT; Package Size: 0402; JLCPCB Basic Part: No; JLCPCB Part Number: C2844323; Supplier 1: LCSC; Category: Capacitors - MLCC; Supplier Part Number 1: C2844323; Tolerance: ±10%; Voltage Rating: 6.3V; RoHS: Yes; ComponentLink1Description: Datasheet; ComponentLink1URL: https://wmsc.lcsc.com/wmsc/upload/file/pdf/v2/lcsc/2304140030_SANYEAR-C0402X6S105K6R3NT_C2844323.pdf; ComponentLink2Description: JLCPCB Part URL; ComponentLink2URL: https://jlcpcb.com/partdetail/C2844323; ComponentLink3Description: LCSC Part URL; ComponentLink3URL: https://lcsc.com/product-detail/Multilayer-Ceramic-Capacitors-MLCC---SMD-SMT_SANYEAR-SANYEAR-C0402X6S105K6R3NT_C2844323.html
footprint CAP-0402 (0402 (1005M) Capacitor)
pins: 1, 2

## C0402X6S105K100NT
designator C?  Capacitance: 1uF  (hidden comment: *)
Capacitor, Ceramic (MLCC), 1uF, ±10%, 10V, ±10%, SMD 0402; Manufacturer: SANYEAR; Manufacturer Part Number: C0402X6S105K100NT; Package Size: 0402; JLCPCB Basic Part: No; JLCPCB Part Number: C2844322; Supplier 1: LCSC; Category: Capacitors - MLCC; Supplier Part Number 1: C2844322; Tolerance: ±10%; Voltage Rating: 10V; RoHS: Yes; ComponentLink1Description: Datasheet; ComponentLink1URL: https://wmsc.lcsc.com/wmsc/upload/file/pdf/v2/lcsc/2304140030_SANYEAR-C0402X6S105K100NT_C2844322.pdf; ComponentLink2Description: JLCPCB Part URL; ComponentLink2URL: https://jlcpcb.com/partdetail/C2844322; ComponentLink3Description: LCSC Part URL; ComponentLink3URL: https://lcsc.com/product-detail/Multilayer-Ceramic-Capacitors-MLCC---SMD-SMT_SANYEAR-SANYEAR-C0402X6S105K100NT_C2844322.html
footprint CAP-0402 (0402 (1005M) Capacitor)
pins: 1, 2

## C0402X6S105K160NT
designator C?  Capacitance: 1uF  (hidden comment: *)
Capacitor, Ceramic (MLCC), 1uF, ±10%, 16V, ±10%, SMD 0402; Manufacturer: SANYEAR; Manufacturer Part Number: C0402X6S105K160NT; Package Size: 0402; JLCPCB Basic Part: No; JLCPCB Part Number: C2835564; Supplier 1: LCSC; Category: Capacitors - MLCC; Supplier Part Number 1: C2835564; Tolerance: ±10%; Voltage Rating: 16V; RoHS: Yes; ComponentLink1Description: Datasheet; ComponentLink1URL: https://wmsc.lcsc.com/wmsc/upload/file/pdf/v2/lcsc/2304140030_SANYEAR-C0402X6S105K160NT_C2835564.pdf; ComponentLink2Description: JLCPCB Part URL; ComponentLink2URL: https://jlcpcb.com/partdetail/C2835564; ComponentLink3Description: LCSC Part URL; ComponentLink3URL: https://lcsc.com/product-detail/Multilayer-Ceramic-Capacitors-MLCC---SMD-SMT_SANYEAR-SANYEAR-C0402X6S105K160NT_C2835564.html
footprint CAP-0402 (0402 (1005M) Capacitor)
pins: 1, 2

## C0402X6S105K250NT
designator C?  Capacitance: 1uF  (hidden comment: *)
Capacitor, Ceramic (MLCC), 1uF, ±10%, 25V, ±10%, SMD 0402; Manufacturer: SANYEAR; Manufacturer Part Number: C0402X6S105K250NT; Package Size: 0402; JLCPCB Basic Part: No; JLCPCB Part Number: C2835563; Supplier 1: LCSC; Category: Capacitors - MLCC; Supplier Part Number 1: C2835563; Tolerance: ±10%; Voltage Rating: 25V; RoHS: Yes; ComponentLink1Description: Datasheet; ComponentLink1URL: https://wmsc.lcsc.com/wmsc/upload/file/pdf/v2/lcsc/2304140030_SANYEAR-C0402X6S105K250NT_C2835563.pdf; ComponentLink2Description: JLCPCB Part URL; ComponentLink2URL: https://jlcpcb.com/partdetail/C2835563; ComponentLink3Description: LCSC Part URL; ComponentLink3URL: https://lcsc.com/product-detail/Multilayer-Ceramic-Capacitors-MLCC---SMD-SMT_SANYEAR-SANYEAR-C0402X6S105K250NT_C2835563.html
footprint CAP-0402 (0402 (1005M) Capacitor)
pins: 1, 2

## C0402X6S106M6R3NT
designator C?  Capacitance: 10uF  (hidden comment: *)
Capacitor, Ceramic (MLCC), 10uF, 6.3V, SMD 0402; Manufacturer: SANYEAR; Manufacturer Part Number: C0402X6S106M6R3NT; Package Size: 0402; JLCPCB Basic Part: No; JLCPCB Part Number: C2835561; Supplier 1: LCSC; Category: Capacitors - MLCC; Supplier Part Number 1: C2835561; Voltage Rating: 6.3V; RoHS: Yes; ComponentLink1Description: Datasheet; ComponentLink1URL: https://wmsc.lcsc.com/wmsc/upload/file/pdf/v2/lcsc/2304140030_SANYEAR-C0402X6S106M6R3NT_C2835561.pdf; ComponentLink2Description: JLCPCB Part URL; ComponentLink2URL: https://jlcpcb.com/partdetail/C2835561; ComponentLink3Description: LCSC Part URL; ComponentLink3URL: https://lcsc.com/product-detail/Multilayer-Ceramic-Capacitors-MLCC---SMD-SMT_SANYEAR-SANYEAR-C0402X6S106M6R3NT_C2835561.html
footprint CAP-0402 (0402 (1005M) Capacitor)
pins: 1, 2

## C0402X6S225K6R3NT
designator C?  Capacitance: 2.2uF  (hidden comment: *)
Capacitor, Ceramic (MLCC), 2.2uF, ±10%, 6.3V, ±10%, SMD 0402; Manufacturer: SANYEAR; Manufacturer Part Number: C0402X6S225K6R3NT; Package Size: 0402; JLCPCB Basic Part: No; JLCPCB Part Number: C2844324; Supplier 1: LCSC; Category: Capacitors - MLCC; Supplier Part Number 1: C2844324; Tolerance: ±10%; Voltage Rating: 6.3V; RoHS: Yes; ComponentLink1Description: Datasheet; ComponentLink1URL: https://wmsc.lcsc.com/wmsc/upload/file/pdf/v2/lcsc/2304140030_SANYEAR-C0402X6S225K6R3NT_C2844324.pdf; ComponentLink2Description: JLCPCB Part URL; ComponentLink2URL: https://jlcpcb.com/partdetail/C2844324; ComponentLink3Description: LCSC Part URL; ComponentLink3URL: https://lcsc.com/product-detail/Multilayer-Ceramic-Capacitors-MLCC---SMD-SMT_SANYEAR-SANYEAR-C0402X6S225K6R3NT_C2844324.html
footprint CAP-0402 (0402 (1005M) Capacitor)
pins: 1, 2

## C0402X6S225K160NT
designator C?  Capacitance: 2.2uF  (hidden comment: *)
Capacitor, Ceramic (MLCC), 2.2uF, ±10%, 16V, ±10%, SMD 0402; Manufacturer: SANYEAR; Manufacturer Part Number: C0402X6S225K160NT; Package Size: 0402; JLCPCB Basic Part: No; JLCPCB Part Number: C2844321; Supplier 1: LCSC; Category: Capacitors - MLCC; Supplier Part Number 1: C2844321; Tolerance: ±10%; Voltage Rating: 16V; RoHS: Yes; ComponentLink1Description: Datasheet; ComponentLink1URL: https://wmsc.lcsc.com/wmsc/upload/file/pdf/v2/lcsc/2304140030_SANYEAR-C0402X6S225K160NT_C2844321.pdf; ComponentLink2Description: JLCPCB Part URL; ComponentLink2URL: https://jlcpcb.com/partdetail/C2844321; ComponentLink3Description: LCSC Part URL; ComponentLink3URL: https://lcsc.com/product-detail/Multilayer-Ceramic-Capacitors-MLCC---SMD-SMT_SANYEAR-SANYEAR-C0402X6S225K160NT_C2844321.html
footprint CAP-0402 (0402 (1005M) Capacitor)
pins: 1, 2

## C0402X6S225M6R3NT
designator C?  Capacitance: 2.2uF  (hidden comment: *)
Capacitor, Ceramic (MLCC), 2.2uF, 6.3V, SMD 0402; Manufacturer: SANYEAR; Manufacturer Part Number: C0402X6S225M6R3NT; Package Size: 0402; JLCPCB Basic Part: No; JLCPCB Part Number: C2835560; Supplier 1: LCSC; Category: Capacitors - MLCC; Supplier Part Number 1: C2835560; Voltage Rating: 6.3V; RoHS: Yes; ComponentLink1Description: Datasheet; ComponentLink1URL: https://wmsc.lcsc.com/wmsc/upload/file/pdf/v2/lcsc/2304140030_SANYEAR-C0402X6S225M6R3NT_C2835560.pdf; ComponentLink2Description: JLCPCB Part URL; ComponentLink2URL: https://jlcpcb.com/partdetail/C2835560; ComponentLink3Description: LCSC Part URL; ComponentLink3URL: https://lcsc.com/product-detail/Multilayer-Ceramic-Capacitors-MLCC---SMD-SMT_SANYEAR-SANYEAR-C0402X6S225M6R3NT_C2835560.html
footprint CAP-0402 (0402 (1005M) Capacitor)
pins: 1, 2

## C0402X6S225M160NT
designator C?  Capacitance: 2.2uF  (hidden comment: *)
Capacitor, Ceramic (MLCC), 2.2uF, 16V, SMD 0402; Manufacturer: SANYEAR; Manufacturer Part Number: C0402X6S225M160NT; Package Size: 0402; JLCPCB Basic Part: No; JLCPCB Part Number: C2844326; Supplier 1: LCSC; Category: Capacitors - MLCC; Supplier Part Number 1: C2844326; Voltage Rating: 16V; RoHS: Yes; ComponentLink1Description: Datasheet; ComponentLink1URL: https://wmsc.lcsc.com/wmsc/upload/file/pdf/v2/lcsc/2304140030_SANYEAR-C0402X6S225M160NT_C2844326.pdf; ComponentLink2Description: JLCPCB Part URL; ComponentLink2URL: https://jlcpcb.com/partdetail/C2844326; ComponentLink3Description: LCSC Part URL; ComponentLink3URL: https://lcsc.com/product-detail/Multilayer-Ceramic-Capacitors-MLCC---SMD-SMT_SANYEAR-SANYEAR-C0402X6S225M160NT_C2844326.html
footprint CAP-0402 (0402 (1005M) Capacitor)
pins: 1, 2

## C0402X7R102J500NT
designator C?  Capacitance: 1nF  (hidden comment: *)
Capacitor, Ceramic (MLCC), 1nF, 50V, SMD 0402; Manufacturer: SANYEAR; Manufacturer Part Number: C0402X7R102J500NT; Package Size: 0402; JLCPCB Basic Part: No; JLCPCB Part Number: C2835536; Supplier 1: LCSC; Category: Capacitors - MLCC; Supplier Part Number 1: C2835536; Voltage Rating: 50V; RoHS: Yes; ComponentLink1Description: Datasheet; ComponentLink1URL: https://wmsc.lcsc.com/wmsc/upload/file/pdf/v2/lcsc/2304140030_SANYEAR-C0402X7R102J500NT_C2835536.pdf; ComponentLink2Description: JLCPCB Part URL; ComponentLink2URL: https://jlcpcb.com/partdetail/C2835536; ComponentLink3Description: LCSC Part URL; ComponentLink3URL: https://lcsc.com/product-detail/Multilayer-Ceramic-Capacitors-MLCC---SMD-SMT_SANYEAR-SANYEAR-C0402X7R102J500NT_C2835536.html
footprint CAP-0402 (0402 (1005M) Capacitor)
pins: 1, 2

## C0402X7R102K250NTB
designator C?  Capacitance: 1nF  (hidden comment: *)
Capacitor, Ceramic (MLCC), 1nF, ±10%, 25V, X7R, ±10%, SMD 0402; Manufacturer: EYANG(Shenzhen Eyang Tech Development); Manufacturer Part Number: C0402X7R102K250NTB; Package Size: 0402; JLCPCB Basic Part: No; JLCPCB Part Number: C778301; Supplier 1: LCSC; Category: Capacitors - MLCC; Supplier Part Number 1: C778301; Tolerance: ±10%; Voltage Rating: 25V; Temperature Coefficient: X7R; RoHS: Yes; ComponentLink1Description: Datasheet; ComponentLink1URL: https://datasheet.lcsc.com/lcsc/2009051507_EYANG-Shenzhen-Eyang-Tech-Development-C0402X7R102K250NTB_C778301.pdf; ComponentLink2Description: JLCPCB Part URL; ComponentLink2URL: https://jlcpcb.com/partdetail/C778301; ComponentLink3Description: LCSC Part URL; ComponentLink3URL: https://lcsc.com/product-detail/Multilayer-Ceramic-Capacitors-MLCC---SMD-SMT_EYANGShenzhen-Eyang-Tech-Development-EYANGShenzhen-Eyang-Tech-Development-C0402X7R102K250NTB_C778301.html
footprint CAP-0402 (0402 (1005M) Capacitor)
pins: 1, 2

## C0402X7R102K500NTB
designator C?  Capacitance: 1nF  (hidden comment: *)
Capacitor, Ceramic (MLCC), 1nF, ±10%, 50V, X7R, ±10%, SMD 0402; Manufacturer: EYANG(Shenzhen Eyang Tech Development); Manufacturer Part Number: C0402X7R102K500NTB; Package Size: 0402; JLCPCB Basic Part: No; JLCPCB Part Number: C115669; Supplier 1: LCSC; Category: Capacitors - MLCC; Supplier Part Number 1: C115669; Tolerance: ±10%; Voltage Rating: 50V; Temperature Coefficient: X7R; RoHS: Yes; ComponentLink1Description: Datasheet; ComponentLink1URL: https://datasheet.lcsc.com/lcsc/2304140030_EYANG-Shenzhen-Eyang-Tech-Development-C0402X7R102K500NTB_C115669.pdf; ComponentLink2Description: JLCPCB Part URL; ComponentLink2URL: https://jlcpcb.com/partdetail/C115669; ComponentLink3Description: LCSC Part URL; ComponentLink3URL: https://lcsc.com/product-detail/Multilayer-Ceramic-Capacitors-MLCC---SMD-SMT_EYANGShenzhen-Eyang-Tech-Development-EYANGShenzhen-Eyang-Tech-Development-C0402X7R102K500NTB_C115669.html
footprint CAP-0402 (0402 (1005M) Capacitor)
pins: 1, 2

## C0402X7R103K100NTB
designator C?  Capacitance: 10nF  (hidden comment: *)
Capacitor, Ceramic (MLCC), 10nF, ±10%, 10V, X7R, ±10%, SMD 0402; Manufacturer: EYANG(Shenzhen Eyang Tech Development); Manufacturer Part Number: C0402X7R103K100NTB; Package Size: 0402; JLCPCB Basic Part: No; JLCPCB Part Number: C783637; Supplier 1: LCSC; Category: Capacitors - MLCC; Supplier Part Number 1: C783637; Tolerance: ±10%; Voltage Rating: 10V; Temperature Coefficient: X7R; RoHS: Yes; ComponentLink1Description: Datasheet; ComponentLink1URL: https://datasheet.lcsc.com/lcsc/2009151637_EYANG-Shenzhen-Eyang-Tech-Development-C0402X7R103K100NTB_C783637.pdf; ComponentLink2Description: JLCPCB Part URL; ComponentLink2URL: https://jlcpcb.com/partdetail/C783637; ComponentLink3Description: LCSC Part URL; ComponentLink3URL: https://lcsc.com/product-detail/Multilayer-Ceramic-Capacitors-MLCC---SMD-SMT_EYANGShenzhen-Eyang-Tech-Development-EYANGShenzhen-Eyang-Tech-Development-C0402X7R103K100NTB_C783637.html
footprint CAP-0402 (0402 (1005M) Capacitor)
pins: 1, 2

## C0402X7R103K250NTB
designator C?  Capacitance: 10nF  (hidden comment: *)
Capacitor, Ceramic (MLCC), 10nF, ±10%, 25V, X7R, ±10%, SMD 0402; Manufacturer: EYANG(Shenzhen Eyang Tech Development); Manufacturer Part Number: C0402X7R103K250NTB; Package Size: 0402; JLCPCB Basic Part: No; JLCPCB Part Number: C183758; Supplier 1: LCSC; Category: Capacitors - MLCC; Supplier Part Number 1: C183758; Tolerance: ±10%; Voltage Rating: 25V; Temperature Coefficient: X7R; RoHS: Yes; ComponentLink1Description: Datasheet; ComponentLink1URL: https://datasheet.lcsc.com/lcsc/2304140030_EYANG-Shenzhen-Eyang-Tech-Development-C0402X7R103K250NTB_C183758.pdf; ComponentLink2Description: JLCPCB Part URL; ComponentLink2URL: https://jlcpcb.com/partdetail/C183758; ComponentLink3Description: LCSC Part URL; ComponentLink3URL: https://lcsc.com/product-detail/Multilayer-Ceramic-Capacitors-MLCC---SMD-SMT_EYANGShenzhen-Eyang-Tech-Development-EYANGShenzhen-Eyang-Tech-Development-C0402X7R103K250NTB_C183758.html
footprint CAP-0402 (0402 (1005M) Capacitor)
pins: 1, 2

## C0402X7R103K500NT
designator C?  Capacitance: 10nF  (hidden comment: *)
Capacitor, Ceramic (MLCC), 10nF, ±10%, 50V, X7R, ±10%, SMD 0402; Manufacturer: SANYEAR; Manufacturer Part Number: C0402X7R103K500NT; Package Size: 0402; JLCPCB Basic Part: No; JLCPCB Part Number: C466608; Supplier 1: LCSC; Category: Capacitors - MLCC; Supplier Part Number 1: C466608; Tolerance: ±10%; Voltage Rating: 50V; Temperature Coefficient: X7R; RoHS: Yes; ComponentLink1Description: Datasheet; ComponentLink1URL: https://wmsc.lcsc.com/wmsc/upload/file/pdf/v2/lcsc/2304140030_SANYEAR-C0402X7R103K500NT_C466608.pdf; ComponentLink2Description: JLCPCB Part URL; ComponentLink2URL: https://jlcpcb.com/partdetail/C466608; ComponentLink3Description: LCSC Part URL; ComponentLink3URL: https://lcsc.com/product-detail/Multilayer-Ceramic-Capacitors-MLCC---SMD-SMT_SANYEAR-SANYEAR-C0402X7R103K500NT_C466608.html
footprint CAP-0402 (0402 (1005M) Capacitor)
pins: 1, 2

## C0402X7R103K500NTB
designator C?  Capacitance: 10nF  (hidden comment: *)
Capacitor, Ceramic (MLCC), 10nF, ±10%, 50V, X7R, ±10%, SMD 0402; Manufacturer: EYANG(Shenzhen Eyang Tech Development); Manufacturer Part Number: C0402X7R103K500NTB; Package Size: 0402; JLCPCB Basic Part: No; JLCPCB Part Number: C115670; Supplier 1: LCSC; Category: Capacitors - MLCC; Supplier Part Number 1: C115670; Tolerance: ±10%; Voltage Rating: 50V; Temperature Coefficient: X7R; RoHS: Yes; ComponentLink1Description: Datasheet; ComponentLink1URL: https://datasheet.lcsc.com/lcsc/2304140030_EYANG-Shenzhen-Eyang-Tech-Development-C0402X7R103K500NTB_C115670.pdf; ComponentLink2Description: JLCPCB Part URL; ComponentLink2URL: https://jlcpcb.com/partdetail/C115670; ComponentLink3Description: LCSC Part URL; ComponentLink3URL: https://lcsc.com/product-detail/Multilayer-Ceramic-Capacitors-MLCC---SMD-SMT_EYANGShenzhen-Eyang-Tech-Development-EYANGShenzhen-Eyang-Tech-Development-C0402X7R103K500NTB_C115670.html
footprint CAP-0402 (0402 (1005M) Capacitor)
pins: 1, 2

## C0402X7R104K160NT
designator C?  Capacitance: 100nF  (hidden comment: *)
Capacitor, Ceramic (MLCC), 100nF, ±10%, 16V, X7R, ±10%, SMD 0402; Manufacturer: SANYEAR; Manufacturer Part Number: C0402X7R104K160NT; Package Size: 0402; JLCPCB Basic Part: No; JLCPCB Part Number: C466613; Supplier 1: LCSC; Category: Capacitors - MLCC; Supplier Part Number 1: C466613; Tolerance: ±10%; Voltage Rating: 16V; Temperature Coefficient: X7R; RoHS: Yes; ComponentLink1Description: Datasheet; ComponentLink1URL: https://wmsc.lcsc.com/wmsc/upload/file/pdf/v2/lcsc/2304140030_SANYEAR-C0402X7R104K160NT_C466613.pdf; ComponentLink2Description: JLCPCB Part URL; ComponentLink2URL: https://jlcpcb.com/partdetail/C466613; ComponentLink3Description: LCSC Part URL; ComponentLink3URL: https://lcsc.com/product-detail/Multilayer-Ceramic-Capacitors-MLCC---SMD-SMT_SANYEAR-SANYEAR-C0402X7R104K160NT_C466613.html
footprint CAP-0402 (0402 (1005M) Capacitor)
pins: 1, 2

## C0402X7R104K160NTB
designator C?  Capacitance: 100nF  (hidden comment: *)
Capacitor, Ceramic (MLCC), 100nF, ±10%, 16V, X7R, ±10%, SMD 0402; Manufacturer: EYANG(Shenzhen Eyang Tech Development); Manufacturer Part Number: C0402X7R104K160NTB; Package Size: 0402; JLCPCB Basic Part: No; JLCPCB Part Number: C115671; Supplier 1: LCSC; Category: Capacitors - MLCC; Supplier Part Number 1: C115671; Tolerance: ±10%; Voltage Rating: 16V; Temperature Coefficient: X7R; RoHS: Yes; ComponentLink1Description: Datasheet; ComponentLink1URL: https://datasheet.lcsc.com/lcsc/2304140030_EYANG-Shenzhen-Eyang-Tech-Development-C0402X7R104K160NTB_C115671.pdf; ComponentLink2Description: JLCPCB Part URL; ComponentLink2URL: https://jlcpcb.com/partdetail/C115671; ComponentLink3Description: LCSC Part URL; ComponentLink3URL: https://lcsc.com/product-detail/Multilayer-Ceramic-Capacitors-MLCC---SMD-SMT_EYANGShenzhen-Eyang-Tech-Development-EYANGShenzhen-Eyang-Tech-Development-C0402X7R104K160NTB_C115671.html
footprint CAP-0402 (0402 (1005M) Capacitor)
pins: 1, 2
